# Altium schematic symbol library jlcpcb_2025_04_capacitors_extended_0603.schlib: 3668 symbols (part 9 of 20)
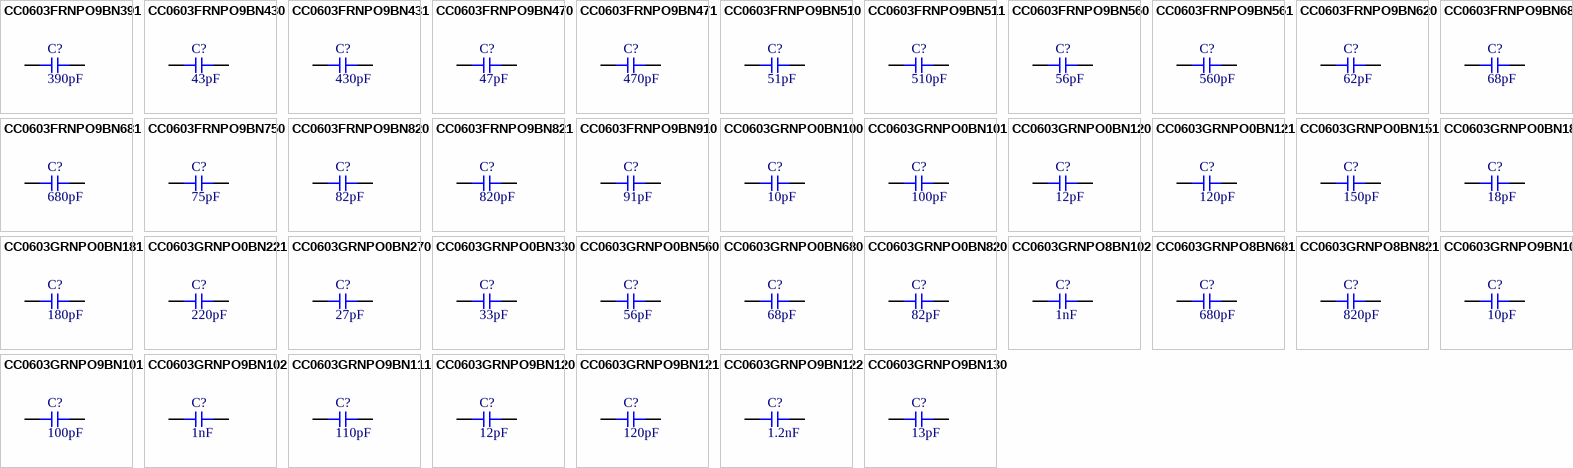
[diagram p99: symbols CC0603FRNPO9BN391 to CC0603GRNPO9BN130]

## CC0603FRNPO9BN470
designator C?  Capacitance: 47pF  (hidden comment: *)
Capacitor, Ceramic (MLCC), 47pF, ±1%, 50V, NP0, ±1%, SMD 0603; Manufacturer: YAGEO; Manufacturer Part Number: CC0603FRNPO9BN470; Package Size: 0603; JLCPCB Basic Part: No; JLCPCB Part Number: C519486; Supplier 1: LCSC; Category: Capacitors - MLCC; Supplier Part Number 1: C519486; Tolerance: ±1%; Voltage Rating: 50V; Temperature Coefficient: NP0; RoHS: Yes; ComponentLink1Description: Datasheet; ComponentLink1URL: https://wmsc.lcsc.com/wmsc/upload/file/pdf/v2/lcsc/2006011835_YAGEO-CC0603FRNPO9BN470_C519486.pdf; ComponentLink2Description: JLCPCB Part URL; ComponentLink2URL: https://jlcpcb.com/partdetail/C519486; ComponentLink3Description: LCSC Part URL; ComponentLink3URL: https://lcsc.com/product-detail/Multilayer-Ceramic-Capacitors-MLCC---SMD-SMT_YAGEO-YAGEO-CC0603FRNPO9BN470_C519486.html
footprint CAP-0603 (0603 (1608M) Capacitor)
pins: 1, 2

## CC0603FRNPO9BN471
designator C?  Capacitance: 470pF  (hidden comment: *)
Capacitor, Ceramic (MLCC), 470pF, ±1%, 50V, NP0, ±1%, SMD 0603; Manufacturer: YAGEO; Manufacturer Part Number: CC0603FRNPO9BN471; Package Size: 0603; JLCPCB Basic Part: No; JLCPCB Part Number: C519564; Supplier 1: LCSC; Category: Capacitors - MLCC; Supplier Part Number 1: C519564; Tolerance: ±1%; Voltage Rating: 50V; Temperature Coefficient: NP0; RoHS: Yes; ComponentLink1Description: Datasheet; ComponentLink1URL: https://wmsc.lcsc.com/wmsc/upload/file/pdf/v2/lcsc/2006011835_YAGEO-CC0603FRNPO9BN471_C519564.pdf; ComponentLink2Description: JLCPCB Part URL; ComponentLink2URL: https://jlcpcb.com/partdetail/C519564; ComponentLink3Description: LCSC Part URL; ComponentLink3URL: https://lcsc.com/product-detail/Multilayer-Ceramic-Capacitors-MLCC---SMD-SMT_YAGEO-YAGEO-CC0603FRNPO9BN471_C519564.html
footprint CAP-0603 (0603 (1608M) Capacitor)
pins: 1, 2

## CC0603FRNPO9BN510
designator C?  Capacitance: 51pF  (hidden comment: *)
Capacitor, Ceramic (MLCC), 51pF, ±1%, 50V, NP0, ±1%, SMD 0603; Manufacturer: YAGEO; Manufacturer Part Number: CC0603FRNPO9BN510; Package Size: 0603; JLCPCB Basic Part: No; JLCPCB Part Number: C519494; Supplier 1: LCSC; Category: Capacitors - MLCC; Supplier Part Number 1: C519494; Tolerance: ±1%; Voltage Rating: 50V; Temperature Coefficient: NP0; RoHS: Yes; ComponentLink1Description: Datasheet; ComponentLink1URL: https://wmsc.lcsc.com/wmsc/upload/file/pdf/v2/lcsc/2005141203_YAGEO-CC0603FRNPO9BN510_C519494.pdf; ComponentLink2Description: JLCPCB Part URL; ComponentLink2URL: https://jlcpcb.com/partdetail/C519494; ComponentLink3Description: LCSC Part URL; ComponentLink3URL: https://lcsc.com/product-detail/Multilayer-Ceramic-Capacitors-MLCC---SMD-SMT_YAGEO-YAGEO-CC0603FRNPO9BN510_C519494.html
footprint CAP-0603 (0603 (1608M) Capacitor)
pins: 1, 2

## CC0603FRNPO9BN511
designator C?  Capacitance: 510pF  (hidden comment: *)
Capacitor, Ceramic (MLCC), 510pF, ±1%, 50V, NP0, ±1%, SMD 0603; Manufacturer: YAGEO; Manufacturer Part Number: CC0603FRNPO9BN511; Package Size: 0603; JLCPCB Basic Part: No; JLCPCB Part Number: C519572; Supplier 1: LCSC; Category: Capacitors - MLCC; Supplier Part Number 1: C519572; Tolerance: ±1%; Voltage Rating: 50V; Temperature Coefficient: NP0; RoHS: Yes; ComponentLink1Description: Datasheet; ComponentLink1URL: https://wmsc.lcsc.com/wmsc/upload/file/pdf/v2/lcsc/2008122133_YAGEO-CC0603FRNPO9BN511_C519572.pdf; ComponentLink2Description: JLCPCB Part URL; ComponentLink2URL: https://jlcpcb.com/partdetail/C519572; ComponentLink3Description: LCSC Part URL; ComponentLink3URL: https://lcsc.com/product-detail/Multilayer-Ceramic-Capacitors-MLCC---SMD-SMT_YAGEO-YAGEO-CC0603FRNPO9BN511_C519572.html
footprint CAP-0603 (0603 (1608M) Capacitor)
pins: 1, 2

## CC0603FRNPO9BN560
designator C?  Capacitance: 56pF  (hidden comment: *)
Capacitor, Ceramic (MLCC), 56pF, ±1%, 50V, NP0, ±1%, SMD 0603; Manufacturer: YAGEO; Manufacturer Part Number: CC0603FRNPO9BN560; Package Size: 0603; JLCPCB Basic Part: No; JLCPCB Part Number: C527049; Supplier 1: LCSC; Category: Capacitors - MLCC; Supplier Part Number 1: C527049; Tolerance: ±1%; Voltage Rating: 50V; Temperature Coefficient: NP0; RoHS: Yes; ComponentLink1Description: Datasheet; ComponentLink1URL: https://wmsc.lcsc.com/wmsc/upload/file/pdf/v2/lcsc/2006181535_YAGEO-CC0603FRNPO9BN560_C527049.pdf; ComponentLink2Description: JLCPCB Part URL; ComponentLink2URL: https://jlcpcb.com/partdetail/C527049; ComponentLink3Description: LCSC Part URL; ComponentLink3URL: https://lcsc.com/product-detail/Multilayer-Ceramic-Capacitors-MLCC---SMD-SMT_YAGEO-YAGEO-CC0603FRNPO9BN560_C527049.html
footprint CAP-0603 (0603 (1608M) Capacitor)
pins: 1, 2

## CC0603FRNPO9BN561
designator C?  Capacitance: 560pF  (hidden comment: *)
Capacitor, Ceramic (MLCC), 560pF, ±1%, 50V, NP0, ±1%, SMD 0603; Manufacturer: YAGEO; Manufacturer Part Number: CC0603FRNPO9BN561; Package Size: 0603; JLCPCB Basic Part: No; JLCPCB Part Number: C519565; Supplier 1: LCSC; Category: Capacitors - MLCC; Supplier Part Number 1: C519565; Tolerance: ±1%; Voltage Rating: 50V; Temperature Coefficient: NP0; RoHS: Yes; ComponentLink1Description: Datasheet; ComponentLink1URL: https://wmsc.lcsc.com/wmsc/upload/file/pdf/v2/lcsc/2006011835_YAGEO-CC0603FRNPO9BN561_C519565.pdf; ComponentLink2Description: JLCPCB Part URL; ComponentLink2URL: https://jlcpcb.com/partdetail/C519565; ComponentLink3Description: LCSC Part URL; ComponentLink3URL: https://lcsc.com/product-detail/Multilayer-Ceramic-Capacitors-MLCC---SMD-SMT_YAGEO-YAGEO-CC0603FRNPO9BN561_C519565.html
footprint CAP-0603 (0603 (1608M) Capacitor)
pins: 1, 2

## CC0603FRNPO9BN620
designator C?  Capacitance: 62pF  (hidden comment: *)
Capacitor, Ceramic (MLCC), 62pF, ±1%, 50V, NP0, ±1%, SMD 0603; Manufacturer: YAGEO; Manufacturer Part Number: CC0603FRNPO9BN620; Package Size: 0603; JLCPCB Basic Part: No; JLCPCB Part Number: C519495; Supplier 1: LCSC; Category: Capacitors - MLCC; Supplier Part Number 1: C519495; Tolerance: ±1%; Voltage Rating: 50V; Temperature Coefficient: NP0; RoHS: Yes; ComponentLink1Description: Datasheet; ComponentLink1URL: https://wmsc.lcsc.com/wmsc/upload/file/pdf/v2/lcsc/2008122133_YAGEO-CC0603FRNPO9BN620_C519495.pdf; ComponentLink2Description: JLCPCB Part URL; ComponentLink2URL: https://jlcpcb.com/partdetail/C519495; ComponentLink3Description: LCSC Part URL; ComponentLink3URL: https://lcsc.com/product-detail/Multilayer-Ceramic-Capacitors-MLCC---SMD-SMT_YAGEO-YAGEO-CC0603FRNPO9BN620_C519495.html
footprint CAP-0603 (0603 (1608M) Capacitor)
pins: 1, 2

## CC0603FRNPO9BN680
designator C?  Capacitance: 68pF  (hidden comment: *)
Capacitor, Ceramic (MLCC), 68pF, ±1%, 50V, NP0, ±1%, SMD 0603; Manufacturer: YAGEO; Manufacturer Part Number: CC0603FRNPO9BN680; Package Size: 0603; JLCPCB Basic Part: No; JLCPCB Part Number: C513699; Supplier 1: LCSC; Category: Capacitors - MLCC; Supplier Part Number 1: C513699; Tolerance: ±1%; Voltage Rating: 50V; Temperature Coefficient: NP0; RoHS: Yes; ComponentLink1Description: Datasheet; ComponentLink1URL: https://wmsc.lcsc.com/wmsc/upload/file/pdf/v2/lcsc/2204121100_YAGEO-CC0603FRNPO9BN680_C513699.pdf; ComponentLink2Description: JLCPCB Part URL; ComponentLink2URL: https://jlcpcb.com/partdetail/C513699; ComponentLink3Description: LCSC Part URL; ComponentLink3URL: https://lcsc.com/product-detail/Multilayer-Ceramic-Capacitors-MLCC---SMD-SMT_YAGEO-YAGEO-CC0603FRNPO9BN680_C513699.html
footprint CAP-0603 (0603 (1608M) Capacitor)
pins: 1, 2

## CC0603FRNPO9BN681
designator C?  Capacitance: 680pF  (hidden comment: *)
Capacitor, Ceramic (MLCC), 680pF, ±1%, 50V, NP0, ±1%, SMD 0603; Manufacturer: YAGEO; Manufacturer Part Number: CC0603FRNPO9BN681; Package Size: 0603; JLCPCB Basic Part: No; JLCPCB Part Number: C519566; Supplier 1: LCSC; Category: Capacitors - MLCC; Supplier Part Number 1: C519566; Tolerance: ±1%; Voltage Rating: 50V; Temperature Coefficient: NP0; RoHS: Yes; ComponentLink1Description: Datasheet; ComponentLink1URL: https://wmsc.lcsc.com/wmsc/upload/file/pdf/v2/lcsc/2006011835_YAGEO-CC0603FRNPO9BN681_C519566.pdf; ComponentLink2Description: JLCPCB Part URL; ComponentLink2URL: https://jlcpcb.com/partdetail/C519566; ComponentLink3Description: LCSC Part URL; ComponentLink3URL: https://lcsc.com/product-detail/Multilayer-Ceramic-Capacitors-MLCC---SMD-SMT_YAGEO-YAGEO-CC0603FRNPO9BN681_C519566.html
footprint CAP-0603 (0603 (1608M) Capacitor)
pins: 1, 2

## CC0603FRNPO9BN750
designator C?  Capacitance: 75pF  (hidden comment: *)
Capacitor, Ceramic (MLCC), 75pF, ±1%, 50V, NP0, ±1%, SMD 0603; Manufacturer: YAGEO; Manufacturer Part Number: CC0603FRNPO9BN750; Package Size: 0603; JLCPCB Basic Part: No; JLCPCB Part Number: C519496; Supplier 1: LCSC; Category: Capacitors - MLCC; Supplier Part Number 1: C519496; Tolerance: ±1%; Voltage Rating: 50V; Temperature Coefficient: NP0; RoHS: Yes; ComponentLink1Description: Datasheet; ComponentLink1URL: https://wmsc.lcsc.com/wmsc/upload/file/pdf/v2/lcsc/2005181835_YAGEO-CC0603FRNPO9BN750_C519496.pdf; ComponentLink2Description: JLCPCB Part URL; ComponentLink2URL: https://jlcpcb.com/partdetail/C519496; ComponentLink3Description: LCSC Part URL; ComponentLink3URL: https://lcsc.com/product-detail/Multilayer-Ceramic-Capacitors-MLCC---SMD-SMT_YAGEO-YAGEO-CC0603FRNPO9BN750_C519496.html
footprint CAP-0603 (0603 (1608M) Capacitor)
pins: 1, 2

## CC0603FRNPO9BN820
designator C?  Capacitance: 82pF  (hidden comment: *)
Capacitor, Ceramic (MLCC), 82pF, ±1%, 50V, NP0, ±1%, SMD 0603; Manufacturer: YAGEO; Manufacturer Part Number: CC0603FRNPO9BN820; Package Size: 0603; JLCPCB Basic Part: No; JLCPCB Part Number: C519487; Supplier 1: LCSC; Category: Capacitors - MLCC; Supplier Part Number 1: C519487; Tolerance: ±1%; Voltage Rating: 50V; Temperature Coefficient: NP0; RoHS: Yes; ComponentLink1Description: Datasheet; ComponentLink1URL: https://wmsc.lcsc.com/wmsc/upload/file/pdf/v2/lcsc/2006011835_YAGEO-CC0603FRNPO9BN820_C519487.pdf; ComponentLink2Description: JLCPCB Part URL; ComponentLink2URL: https://jlcpcb.com/partdetail/C519487; ComponentLink3Description: LCSC Part URL; ComponentLink3URL: https://lcsc.com/product-detail/Multilayer-Ceramic-Capacitors-MLCC---SMD-SMT_YAGEO-YAGEO-CC0603FRNPO9BN820_C519487.html
footprint CAP-0603 (0603 (1608M) Capacitor)
pins: 1, 2

## CC0603FRNPO9BN821
designator C?  Capacitance: 820pF  (hidden comment: *)
Capacitor, Ceramic (MLCC), 820pF, ±1%, 50V, NP0, ±1%, SMD 0603; Manufacturer: YAGEO; Manufacturer Part Number: CC0603FRNPO9BN821; Package Size: 0603; JLCPCB Basic Part: No; JLCPCB Part Number: C519567; Supplier 1: LCSC; Category: Capacitors - MLCC; Supplier Part Number 1: C519567; Tolerance: ±1%; Voltage Rating: 50V; Temperature Coefficient: NP0; RoHS: Yes; ComponentLink1Description: Datasheet; ComponentLink1URL: https://wmsc.lcsc.com/wmsc/upload/file/pdf/v2/lcsc/2008191833_YAGEO-CC0603FRNPO9BN821_C519567.pdf; ComponentLink2Description: JLCPCB Part URL; ComponentLink2URL: https://jlcpcb.com/partdetail/C519567; ComponentLink3Description: LCSC Part URL; ComponentLink3URL: https://lcsc.com/product-detail/Multilayer-Ceramic-Capacitors-MLCC---SMD-SMT_YAGEO-YAGEO-CC0603FRNPO9BN821_C519567.html
footprint CAP-0603 (0603 (1608M) Capacitor)
pins: 1, 2

## CC0603FRNPO9BN910
designator C?  Capacitance: 91pF  (hidden comment: *)
Capacitor, Ceramic (MLCC), 91pF, ±1%, 50V, NP0, ±1%, SMD 0603; Manufacturer: YAGEO; Manufacturer Part Number: CC0603FRNPO9BN910; Package Size: 0603; JLCPCB Basic Part: No; JLCPCB Part Number: C519497; Supplier 1: LCSC; Category: Capacitors - MLCC; Supplier Part Number 1: C519497; Tolerance: ±1%; Voltage Rating: 50V; Temperature Coefficient: NP0; RoHS: Yes; ComponentLink1Description: Datasheet; ComponentLink1URL: https://wmsc.lcsc.com/wmsc/upload/file/pdf/v2/lcsc/2006011835_YAGEO-CC0603FRNPO9BN910_C519497.pdf; ComponentLink2Description: JLCPCB Part URL; ComponentLink2URL: https://jlcpcb.com/partdetail/C519497; ComponentLink3Description: LCSC Part URL; ComponentLink3URL: https://lcsc.com/product-detail/Multilayer-Ceramic-Capacitors-MLCC---SMD-SMT_YAGEO-YAGEO-CC0603FRNPO9BN910_C519497.html
footprint CAP-0603 (0603 (1608M) Capacitor)
pins: 1, 2

## CC0603GRNPO0BN100
designator C?  Capacitance: 10pF  (hidden comment: *)
Capacitor, Ceramic (MLCC), 10pF, ±2%, 100V, NP0, ±2%, SMD 0603; Manufacturer: YAGEO; Manufacturer Part Number: CC0603GRNPO0BN100; Package Size: 0603; JLCPCB Basic Part: No; JLCPCB Part Number: C527050; Supplier 1: LCSC; Category: Capacitors - MLCC; Supplier Part Number 1: C527050; Tolerance: ±2%; Voltage Rating: 100V; Temperature Coefficient: NP0; RoHS: Yes; ComponentLink1Description: Datasheet; ComponentLink1URL: https://wmsc.lcsc.com/wmsc/upload/file/pdf/v2/lcsc/2006241834_YAGEO-CC0603GRNPO0BN100_C527050.pdf; ComponentLink2Description: JLCPCB Part URL; ComponentLink2URL: https://jlcpcb.com/partdetail/C527050; ComponentLink3Description: LCSC Part URL; ComponentLink3URL: https://lcsc.com/product-detail/Multilayer-Ceramic-Capacitors-MLCC---SMD-SMT_YAGEO-YAGEO-CC0603GRNPO0BN100_C527050.html
footprint CAP-0603 (0603 (1608M) Capacitor)
pins: 1, 2

## CC0603GRNPO0BN101
designator C?  Capacitance: 100pF  (hidden comment: *)
Capacitor, Ceramic (MLCC), 100pF, ±2%, 100V, NP0, ±2%, SMD 0603; Manufacturer: YAGEO; Manufacturer Part Number: CC0603GRNPO0BN101; Package Size: 0603; JLCPCB Basic Part: No; JLCPCB Part Number: C576781; Supplier 1: LCSC; Category: Capacitors - MLCC; Supplier Part Number 1: C576781; Tolerance: ±2%; Voltage Rating: 100V; Temperature Coefficient: NP0; RoHS: Yes; ComponentLink1Description: Datasheet; ComponentLink1URL: https://wmsc.lcsc.com/wmsc/upload/file/pdf/v2/lcsc/2311211121_YAGEO-CC0603GRNPO0BN101_C576781.pdf; ComponentLink2Description: JLCPCB Part URL; ComponentLink2URL: https://jlcpcb.com/partdetail/C576781; ComponentLink3Description: LCSC Part URL; ComponentLink3URL: https://lcsc.com/product-detail/Multilayer-Ceramic-Capacitors-MLCC---SMD-SMT_YAGEO-YAGEO-CC0603GRNPO0BN101_C576781.html
footprint CAP-0603 (0603 (1608M) Capacitor)
pins: 1, 2

## CC0603GRNPO0BN120
designator C?  Capacitance: 12pF  (hidden comment: *)
Capacitor, Ceramic (MLCC), 12pF, ±2%, 100V, NP0, ±2%, SMD 0603; Manufacturer: YAGEO; Manufacturer Part Number: CC0603GRNPO0BN120; Package Size: 0603; JLCPCB Basic Part: No; JLCPCB Part Number: C527051; Supplier 1: LCSC; Category: Capacitors - MLCC; Supplier Part Number 1: C527051; Tolerance: ±2%; Voltage Rating: 100V; Temperature Coefficient: NP0; RoHS: Yes; ComponentLink1Description: Datasheet; ComponentLink1URL: https://wmsc.lcsc.com/wmsc/upload/file/pdf/v2/lcsc/2007221234_YAGEO-CC0603GRNPO0BN120_C527051.pdf; ComponentLink2Description: JLCPCB Part URL; ComponentLink2URL: https://jlcpcb.com/partdetail/C527051; ComponentLink3Description: LCSC Part URL; ComponentLink3URL: https://lcsc.com/product-detail/Multilayer-Ceramic-Capacitors-MLCC---SMD-SMT_YAGEO-YAGEO-CC0603GRNPO0BN120_C527051.html
footprint CAP-0603 (0603 (1608M) Capacitor)
pins: 1, 2

## CC0603GRNPO0BN121
designator C?  Capacitance: 120pF  (hidden comment: *)
Capacitor, Ceramic (MLCC), 120pF, ±2%, 100V, NP0, ±2%, SMD 0603; Manufacturer: YAGEO; Manufacturer Part Number: CC0603GRNPO0BN121; Package Size: 0603; JLCPCB Basic Part: No; JLCPCB Part Number: C527052; Supplier 1: LCSC; Category: Capacitors - MLCC; Supplier Part Number 1: C527052; Tolerance: ±2%; Voltage Rating: 100V; Temperature Coefficient: NP0; RoHS: Yes; ComponentLink1Description: Datasheet; ComponentLink1URL: https://wmsc.lcsc.com/wmsc/upload/file/pdf/v2/lcsc/2006181535_YAGEO-CC0603GRNPO0BN121_C527052.pdf; ComponentLink2Description: JLCPCB Part URL; ComponentLink2URL: https://jlcpcb.com/partdetail/C527052; ComponentLink3Description: LCSC Part URL; ComponentLink3URL: https://lcsc.com/product-detail/Multilayer-Ceramic-Capacitors-MLCC---SMD-SMT_YAGEO-YAGEO-CC0603GRNPO0BN121_C527052.html
footprint CAP-0603 (0603 (1608M) Capacitor)
pins: 1, 2

## CC0603GRNPO0BN151
designator C?  Capacitance: 150pF  (hidden comment: *)
Capacitor, Ceramic (MLCC), 150pF, ±2%, 100V, NP0, ±2%, SMD 0603; Manufacturer: YAGEO; Manufacturer Part Number: CC0603GRNPO0BN151; Package Size: 0603; JLCPCB Basic Part: No; JLCPCB Part Number: C576784; Supplier 1: LCSC; Category: Capacitors - MLCC; Supplier Part Number 1: C576784; Tolerance: ±2%; Voltage Rating: 100V; Temperature Coefficient: NP0; RoHS: Yes; ComponentLink1Description: Datasheet; ComponentLink1URL: https://wmsc.lcsc.com/wmsc/upload/file/pdf/v2/lcsc/2311211121_YAGEO-CC0603GRNPO0BN151_C576784.pdf; ComponentLink2Description: JLCPCB Part URL; ComponentLink2URL: https://jlcpcb.com/partdetail/C576784; ComponentLink3Description: LCSC Part URL; ComponentLink3URL: https://lcsc.com/product-detail/Multilayer-Ceramic-Capacitors-MLCC---SMD-SMT_YAGEO-YAGEO-CC0603GRNPO0BN151_C576784.html
footprint CAP-0603 (0603 (1608M) Capacitor)
pins: 1, 2

## CC0603GRNPO0BN180
designator C?  Capacitance: 18pF  (hidden comment: *)
Capacitor, Ceramic (MLCC), 18pF, ±2%, 100V, NP0, ±2%, SMD 0603; Manufacturer: YAGEO; Manufacturer Part Number: CC0603GRNPO0BN180; Package Size: 0603; JLCPCB Basic Part: No; JLCPCB Part Number: C576786; Supplier 1: LCSC; Category: Capacitors - MLCC; Supplier Part Number 1: C576786; Tolerance: ±2%; Voltage Rating: 100V; Temperature Coefficient: NP0; RoHS: Yes; ComponentLink1Description: Datasheet; ComponentLink1URL: https://wmsc.lcsc.com/wmsc/upload/file/pdf/v2/lcsc/2211281000_YAGEO-CC0603GRNPO0BN180_C576786.pdf; ComponentLink2Description: JLCPCB Part URL; ComponentLink2URL: https://jlcpcb.com/partdetail/C576786; ComponentLink3Description: LCSC Part URL; ComponentLink3URL: https://lcsc.com/product-detail/Multilayer-Ceramic-Capacitors-MLCC---SMD-SMT_YAGEO-YAGEO-CC0603GRNPO0BN180_C576786.html
footprint CAP-0603 (0603 (1608M) Capacitor)
pins: 1, 2

## CC0603GRNPO0BN181
designator C?  Capacitance: 180pF  (hidden comment: *)
Capacitor, Ceramic (MLCC), 180pF, ±2%, 100V, NP0, ±2%, SMD 0603; Manufacturer: YAGEO; Manufacturer Part Number: CC0603GRNPO0BN181; Package Size: 0603; JLCPCB Basic Part: No; JLCPCB Part Number: C527053; Supplier 1: LCSC; Category: Capacitors - MLCC; Supplier Part Number 1: C527053; Tolerance: ±2%; Voltage Rating: 100V; Temperature Coefficient: NP0; RoHS: Yes; ComponentLink1Description: Datasheet; ComponentLink1URL: https://wmsc.lcsc.com/wmsc/upload/file/pdf/v2/lcsc/2008131832_YAGEO-CC0603GRNPO0BN181_C527053.pdf; ComponentLink2Description: JLCPCB Part URL; ComponentLink2URL: https://jlcpcb.com/partdetail/C527053; ComponentLink3Description: LCSC Part URL; ComponentLink3URL: https://lcsc.com/product-detail/Multilayer-Ceramic-Capacitors-MLCC---SMD-SMT_YAGEO-YAGEO-CC0603GRNPO0BN181_C527053.html
footprint CAP-0603 (0603 (1608M) Capacitor)
pins: 1, 2

## CC0603GRNPO0BN221
designator C?  Capacitance: 220pF  (hidden comment: *)
Capacitor, Ceramic (MLCC), 220pF, ±2%, 100V, NP0, ±2%, SMD 0603; Manufacturer: YAGEO; Manufacturer Part Number: CC0603GRNPO0BN221; Package Size: 0603; JLCPCB Basic Part: No; JLCPCB Part Number: C576788; Supplier 1: LCSC; Category: Capacitors - MLCC; Supplier Part Number 1: C576788; Tolerance: ±2%; Voltage Rating: 100V; Temperature Coefficient: NP0; RoHS: Yes; ComponentLink1Description: Datasheet; ComponentLink1URL: https://wmsc.lcsc.com/wmsc/upload/file/pdf/v2/lcsc/2009261808_YAGEO-CC0603GRNPO0BN221_C576788.pdf; ComponentLink2Description: JLCPCB Part URL; ComponentLink2URL: https://jlcpcb.com/partdetail/C576788; ComponentLink3Description: LCSC Part URL; ComponentLink3URL: https://lcsc.com/product-detail/Multilayer-Ceramic-Capacitors-MLCC---SMD-SMT_YAGEO-YAGEO-CC0603GRNPO0BN221_C576788.html
footprint CAP-0603 (0603 (1608M) Capacitor)
pins: 1, 2

## CC0603GRNPO0BN270
designator C?  Capacitance: 27pF  (hidden comment: *)
Capacitor, Ceramic (MLCC), 27pF, ±2%, 100V, NP0, ±2%, SMD 0603; Manufacturer: YAGEO; Manufacturer Part Number: CC0603GRNPO0BN270; Package Size: 0603; JLCPCB Basic Part: No; JLCPCB Part Number: C527055; Supplier 1: LCSC; Category: Capacitors - MLCC; Supplier Part Number 1: C527055; Tolerance: ±2%; Voltage Rating: 100V; Temperature Coefficient: NP0; RoHS: Yes; ComponentLink1Description: Datasheet; ComponentLink1URL: https://wmsc.lcsc.com/wmsc/upload/file/pdf/v2/lcsc/2006181535_YAGEO-CC0603GRNPO0BN270_C527055.pdf; ComponentLink2Description: JLCPCB Part URL; ComponentLink2URL: https://jlcpcb.com/partdetail/C527055; ComponentLink3Description: LCSC Part URL; ComponentLink3URL: https://lcsc.com/product-detail/Multilayer-Ceramic-Capacitors-MLCC---SMD-SMT_YAGEO-YAGEO-CC0603GRNPO0BN270_C527055.html
footprint CAP-0603 (0603 (1608M) Capacitor)
pins: 1, 2

## CC0603GRNPO0BN330
designator C?  Capacitance: 33pF  (hidden comment: *)
Capacitor, Ceramic (MLCC), 33pF, ±2%, 100V, NP0, ±2%, SMD 0603; Manufacturer: YAGEO; Manufacturer Part Number: CC0603GRNPO0BN330; Package Size: 0603; JLCPCB Basic Part: No; JLCPCB Part Number: C527056; Supplier 1: LCSC; Category: Capacitors - MLCC; Supplier Part Number 1: C527056; Tolerance: ±2%; Voltage Rating: 100V; Temperature Coefficient: NP0; RoHS: Yes; ComponentLink1Description: Datasheet; ComponentLink1URL: https://wmsc.lcsc.com/wmsc/upload/file/pdf/v2/lcsc/2007021836_YAGEO-CC0603GRNPO0BN330_C527056.pdf; ComponentLink2Description: JLCPCB Part URL; ComponentLink2URL: https://jlcpcb.com/partdetail/C527056; ComponentLink3Description: LCSC Part URL; ComponentLink3URL: https://lcsc.com/product-detail/Multilayer-Ceramic-Capacitors-MLCC---SMD-SMT_YAGEO-YAGEO-CC0603GRNPO0BN330_C527056.html
footprint CAP-0603 (0603 (1608M) Capacitor)
pins: 1, 2

## CC0603GRNPO0BN560
designator C?  Capacitance: 56pF  (hidden comment: *)
Capacitor, Ceramic (MLCC), 56pF, ±2%, 100V, NP0, ±2%, SMD 0603; Manufacturer: YAGEO; Manufacturer Part Number: CC0603GRNPO0BN560; Package Size: 0603; JLCPCB Basic Part: No; JLCPCB Part Number: C527058; Supplier 1: LCSC; Category: Capacitors - MLCC; Supplier Part Number 1: C527058; Tolerance: ±2%; Voltage Rating: 100V; Temperature Coefficient: NP0; RoHS: Yes; ComponentLink1Description: Datasheet; ComponentLink1URL: https://wmsc.lcsc.com/wmsc/upload/file/pdf/v2/lcsc/2005222139_YAGEO-CC0603GRNPO0BN560_C527058.pdf; ComponentLink2Description: JLCPCB Part URL; ComponentLink2URL: https://jlcpcb.com/partdetail/C527058; ComponentLink3Description: LCSC Part URL; ComponentLink3URL: https://lcsc.com/product-detail/Multilayer-Ceramic-Capacitors-MLCC---SMD-SMT_YAGEO-YAGEO-CC0603GRNPO0BN560_C527058.html
footprint CAP-0603 (0603 (1608M) Capacitor)
pins: 1, 2

## CC0603GRNPO0BN680
designator C?  Capacitance: 68pF  (hidden comment: *)
Capacitor, Ceramic (MLCC), 68pF, ±2%, 100V, NP0, ±2%, SMD 0603; Manufacturer: YAGEO; Manufacturer Part Number: CC0603GRNPO0BN680; Package Size: 0603; JLCPCB Basic Part: No; JLCPCB Part Number: C576791; Supplier 1: LCSC; Category: Capacitors - MLCC; Supplier Part Number 1: C576791; Tolerance: ±2%; Voltage Rating: 100V; Temperature Coefficient: NP0; RoHS: Yes; ComponentLink1Description: Datasheet; ComponentLink1URL: https://wmsc.lcsc.com/wmsc/upload/file/pdf/v2/lcsc/2303021100_YAGEO-CC0603GRNPO0BN680_C576791.pdf; ComponentLink2Description: JLCPCB Part URL; ComponentLink2URL: https://jlcpcb.com/partdetail/C576791; ComponentLink3Description: LCSC Part URL; ComponentLink3URL: https://lcsc.com/product-detail/Multilayer-Ceramic-Capacitors-MLCC---SMD-SMT_YAGEO-YAGEO-CC0603GRNPO0BN680_C576791.html
footprint CAP-0603 (0603 (1608M) Capacitor)
pins: 1, 2

## CC0603GRNPO0BN820
designator C?  Capacitance: 82pF  (hidden comment: *)
Capacitor, Ceramic (MLCC), 82pF, ±2%, 100V, NP0, ±2%, SMD 0603; Manufacturer: YAGEO; Manufacturer Part Number: CC0603GRNPO0BN820; Package Size: 0603; JLCPCB Basic Part: No; JLCPCB Part Number: C576792; Supplier 1: LCSC; Category: Capacitors - MLCC; Supplier Part Number 1: C576792; Tolerance: ±2%; Voltage Rating: 100V; Temperature Coefficient: NP0; RoHS: Yes; ComponentLink1Description: Datasheet; ComponentLink1URL: https://wmsc.lcsc.com/wmsc/upload/file/pdf/v2/lcsc/2009261808_YAGEO-CC0603GRNPO0BN820_C576792.pdf; ComponentLink2Description: JLCPCB Part URL; ComponentLink2URL: https://jlcpcb.com/partdetail/C576792; ComponentLink3Description: LCSC Part URL; ComponentLink3URL: https://lcsc.com/product-detail/Multilayer-Ceramic-Capacitors-MLCC---SMD-SMT_YAGEO-YAGEO-CC0603GRNPO0BN820_C576792.html
footprint CAP-0603 (0603 (1608M) Capacitor)
pins: 1, 2

## CC0603GRNPO8BN102
designator C?  Capacitance: 1nF  (hidden comment: *)
Capacitor, Ceramic (MLCC), 1nF, ±2%, 25V, NP0, ±2%, SMD 0603; Manufacturer: YAGEO; Manufacturer Part Number: CC0603GRNPO8BN102; Package Size: 0603; JLCPCB Basic Part: No; JLCPCB Part Number: C519480; Supplier 1: LCSC; Category: Capacitors - MLCC; Supplier Part Number 1: C519480; Tolerance: ±2%; Voltage Rating: 25V; Temperature Coefficient: NP0; RoHS: Yes; ComponentLink1Description: Datasheet; ComponentLink1URL: https://wmsc.lcsc.com/wmsc/upload/file/pdf/v2/lcsc/2005181835_YAGEO-CC0603GRNPO8BN102_C519480.pdf; ComponentLink2Description: JLCPCB Part URL; ComponentLink2URL: https://jlcpcb.com/partdetail/C519480; ComponentLink3Description: LCSC Part URL; ComponentLink3URL: https://lcsc.com/product-detail/Multilayer-Ceramic-Capacitors-MLCC---SMD-SMT_YAGEO-YAGEO-CC0603GRNPO8BN102_C519480.html
footprint CAP-0603 (0603 (1608M) Capacitor)
pins: 1, 2

## CC0603GRNPO8BN681
designator C?  Capacitance: 680pF  (hidden comment: *)
Capacitor, Ceramic (MLCC), 680pF, ±2%, 25V, NP0, ±2%, SMD 0603; Manufacturer: YAGEO; Manufacturer Part Number: CC0603GRNPO8BN681; Package Size: 0603; JLCPCB Basic Part: No; JLCPCB Part Number: C527059; Supplier 1: LCSC; Category: Capacitors - MLCC; Supplier Part Number 1: C527059; Tolerance: ±2%; Voltage Rating: 25V; Temperature Coefficient: NP0; RoHS: Yes; ComponentLink1Description: Datasheet; ComponentLink1URL: https://wmsc.lcsc.com/wmsc/upload/file/pdf/v2/lcsc/2007221234_YAGEO-CC0603GRNPO8BN681_C527059.pdf; ComponentLink2Description: JLCPCB Part URL; ComponentLink2URL: https://jlcpcb.com/partdetail/C527059; ComponentLink3Description: LCSC Part URL; ComponentLink3URL: https://lcsc.com/product-detail/Multilayer-Ceramic-Capacitors-MLCC---SMD-SMT_YAGEO-YAGEO-CC0603GRNPO8BN681_C527059.html
footprint CAP-0603 (0603 (1608M) Capacitor)
pins: 1, 2

## CC0603GRNPO8BN821
designator C?  Capacitance: 820pF  (hidden comment: *)
Capacitor, Ceramic (MLCC), 820pF, ±2%, 25V, NP0, ±2%, SMD 0603; Manufacturer: YAGEO; Manufacturer Part Number: CC0603GRNPO8BN821; Package Size: 0603; JLCPCB Basic Part: No; JLCPCB Part Number: C519470; Supplier 1: LCSC; Category: Capacitors - MLCC; Supplier Part Number 1: C519470; Tolerance: ±2%; Voltage Rating: 25V; Temperature Coefficient: NP0; RoHS: Yes; ComponentLink1Description: Datasheet; ComponentLink1URL: https://wmsc.lcsc.com/wmsc/upload/file/pdf/v2/lcsc/2010251433_YAGEO-CC0603GRNPO8BN821_C519470.pdf; ComponentLink2Description: JLCPCB Part URL; ComponentLink2URL: https://jlcpcb.com/partdetail/C519470; ComponentLink3Description: LCSC Part URL; ComponentLink3URL: https://lcsc.com/product-detail/Multilayer-Ceramic-Capacitors-MLCC---SMD-SMT_YAGEO-YAGEO-CC0603GRNPO8BN821_C519470.html
footprint CAP-0603 (0603 (1608M) Capacitor)
pins: 1, 2

## CC0603GRNPO9BN100
designator C?  Capacitance: 10pF  (hidden comment: *)
Capacitor, Ceramic (MLCC), 10pF, ±2%, 50V, NP0, ±2%, SMD 0603; Manufacturer: YAGEO; Manufacturer Part Number: CC0603GRNPO9BN100; Package Size: 0603; JLCPCB Basic Part: No; JLCPCB Part Number: C325468; Supplier 1: LCSC; Category: Capacitors - MLCC; Supplier Part Number 1: C325468; Tolerance: ±2%; Voltage Rating: 50V; Temperature Coefficient: NP0; RoHS: Yes; ComponentLink1Description: Datasheet; ComponentLink1URL: https://wmsc.lcsc.com/wmsc/upload/file/pdf/v2/lcsc/2304140030_YAGEO-CC0603GRNPO9BN100_C325468.pdf; ComponentLink2Description: JLCPCB Part URL; ComponentLink2URL: https://jlcpcb.com/partdetail/C325468; ComponentLink3Description: LCSC Part URL; ComponentLink3URL: https://lcsc.com/product-detail/Multilayer-Ceramic-Capacitors-MLCC---SMD-SMT_YAGEO-YAGEO-CC0603GRNPO9BN100_C325468.html
footprint CAP-0603 (0603 (1608M) Capacitor)
pins: 1, 2

## CC0603GRNPO9BN101
designator C?  Capacitance: 100pF  (hidden comment: *)
Capacitor, Ceramic (MLCC), 100pF, ±2%, 50V, NP0, ±2%, SMD 0603; Manufacturer: YAGEO; Manufacturer Part Number: CC0603GRNPO9BN101; Package Size: 0603; JLCPCB Basic Part: No; JLCPCB Part Number: C519449; Supplier 1: LCSC; Category: Capacitors - MLCC; Supplier Part Number 1: C519449; Tolerance: ±2%; Voltage Rating: 50V; Temperature Coefficient: NP0; RoHS: Yes; ComponentLink1Description: Datasheet; ComponentLink1URL: https://wmsc.lcsc.com/wmsc/upload/file/pdf/v2/lcsc/2005181835_YAGEO-CC0603GRNPO9BN101_C519449.pdf; ComponentLink2Description: JLCPCB Part URL; ComponentLink2URL: https://jlcpcb.com/partdetail/C519449; ComponentLink3Description: LCSC Part URL; ComponentLink3URL: https://lcsc.com/product-detail/Multilayer-Ceramic-Capacitors-MLCC---SMD-SMT_YAGEO-YAGEO-CC0603GRNPO9BN101_C519449.html
footprint CAP-0603 (0603 (1608M) Capacitor)
pins: 1, 2

## CC0603GRNPO9BN102
designator C?  Capacitance: 1nF  (hidden comment: *)
Capacitor, Ceramic (MLCC), 1nF, ±2%, 50V, NP0, ±2%, SMD 0603; Manufacturer: YAGEO; Manufacturer Part Number: CC0603GRNPO9BN102; Package Size: 0603; JLCPCB Basic Part: No; JLCPCB Part Number: C519481; Supplier 1: LCSC; Category: Capacitors - MLCC; Supplier Part Number 1: C519481; Tolerance: ±2%; Voltage Rating: 50V; Temperature Coefficient: NP0; RoHS: Yes; ComponentLink1Description: Datasheet; ComponentLink1URL: https://wmsc.lcsc.com/wmsc/upload/file/pdf/v2/lcsc/2007101233_YAGEO-CC0603GRNPO9BN102_C519481.pdf; ComponentLink2Description: JLCPCB Part URL; ComponentLink2URL: https://jlcpcb.com/partdetail/C519481; ComponentLink3Description: LCSC Part URL; ComponentLink3URL: https://lcsc.com/product-detail/Multilayer-Ceramic-Capacitors-MLCC---SMD-SMT_YAGEO-YAGEO-CC0603GRNPO9BN102_C519481.html
footprint CAP-0603 (0603 (1608M) Capacitor)
pins: 1, 2

## CC0603GRNPO9BN111
designator C?  Capacitance: 110pF  (hidden comment: *)
Capacitor, Ceramic (MLCC), 110pF, ±2%, 50V, NP0, ±2%, SMD 0603; Manufacturer: YAGEO; Manufacturer Part Number: CC0603GRNPO9BN111; Package Size: 0603; JLCPCB Basic Part: No; JLCPCB Part Number: C519475; Supplier 1: LCSC; Category: Capacitors - MLCC; Supplier Part Number 1: C519475; Tolerance: ±2%; Voltage Rating: 50V; Temperature Coefficient: NP0; RoHS: Yes; ComponentLink1Description: Datasheet; ComponentLink1URL: https://wmsc.lcsc.com/wmsc/upload/file/pdf/v2/lcsc/2008051835_YAGEO-CC0603GRNPO9BN111_C519475.pdf; ComponentLink2Description: JLCPCB Part URL; ComponentLink2URL: https://jlcpcb.com/partdetail/C519475; ComponentLink3Description: LCSC Part URL; ComponentLink3URL: https://lcsc.com/product-detail/Multilayer-Ceramic-Capacitors-MLCC---SMD-SMT_YAGEO-YAGEO-CC0603GRNPO9BN111_C519475.html
footprint CAP-0603 (0603 (1608M) Capacitor)
pins: 1, 2

## CC0603GRNPO9BN120
designator C?  Capacitance: 12pF  (hidden comment: *)
Capacitor, Ceramic (MLCC), 12pF, ±2%, 50V, NP0, ±2%, SMD 0603; Manufacturer: YAGEO; Manufacturer Part Number: CC0603GRNPO9BN120; Package Size: 0603; JLCPCB Basic Part: No; JLCPCB Part Number: C519450; Supplier 1: LCSC; Category: Capacitors - MLCC; Supplier Part Number 1: C519450; Tolerance: ±2%; Voltage Rating: 50V; Temperature Coefficient: NP0; RoHS: Yes; ComponentLink1Description: Datasheet; ComponentLink1URL: https://wmsc.lcsc.com/wmsc/upload/file/pdf/v2/lcsc/2007161233_YAGEO-CC0603GRNPO9BN120_C519450.pdf; ComponentLink2Description: JLCPCB Part URL; ComponentLink2URL: https://jlcpcb.com/partdetail/C519450; ComponentLink3Description: LCSC Part URL; ComponentLink3URL: https://lcsc.com/product-detail/Multilayer-Ceramic-Capacitors-MLCC---SMD-SMT_YAGEO-YAGEO-CC0603GRNPO9BN120_C519450.html
footprint CAP-0603 (0603 (1608M) Capacitor)
pins: 1, 2

## CC0603GRNPO9BN121
designator C?  Capacitance: 120pF  (hidden comment: *)
Capacitor, Ceramic (MLCC), 120pF, ±2%, 50V, NP0, ±2%, SMD 0603; Manufacturer: YAGEO; Manufacturer Part Number: CC0603GRNPO9BN121; Package Size: 0603; JLCPCB Basic Part: No; JLCPCB Part Number: C327168; Supplier 1: LCSC; Category: Capacitors - MLCC; Supplier Part Number 1: C327168; Tolerance: ±2%; Voltage Rating: 50V; Temperature Coefficient: NP0; RoHS: Yes; ComponentLink1Description: Datasheet; ComponentLink1URL: https://wmsc.lcsc.com/wmsc/upload/file/pdf/v2/lcsc/1811141243_YAGEO-CC0603GRNPO9BN121_C327168.pdf; ComponentLink2Description: JLCPCB Part URL; ComponentLink2URL: https://jlcpcb.com/partdetail/C327168; ComponentLink3Description: LCSC Part URL; ComponentLink3URL: https://lcsc.com/product-detail/Multilayer-Ceramic-Capacitors-MLCC---SMD-SMT_YAGEO-YAGEO-CC0603GRNPO9BN121_C327168.html
footprint CAP-0603 (0603 (1608M) Capacitor)
pins: 1, 2

## CC0603GRNPO9BN122
designator C?  Capacitance: 1.2nF  (hidden comment: *)
Capacitor, Ceramic (MLCC), 1.2nF, ±2%, 50V, NP0, ±2%, SMD 0603; Manufacturer: YAGEO; Manufacturer Part Number: CC0603GRNPO9BN122; Package Size: 0603; JLCPCB Basic Part: No; JLCPCB Part Number: C576796; Supplier 1: LCSC; Category: Capacitors - MLCC; Supplier Part Number 1: C576796; Tolerance: ±2%; Voltage Rating: 50V; Temperature Coefficient: NP0; RoHS: Yes; ComponentLink1Description: Datasheet; ComponentLink1URL: https://wmsc.lcsc.com/wmsc/upload/file/pdf/v2/lcsc/2207141800_YAGEO-CC0603GRNPO9BN122_C576796.pdf; ComponentLink2Description: JLCPCB Part URL; ComponentLink2URL: https://jlcpcb.com/partdetail/C576796; ComponentLink3Description: LCSC Part URL; ComponentLink3URL: https://lcsc.com/product-detail/Multilayer-Ceramic-Capacitors-MLCC---SMD-SMT_YAGEO-YAGEO-CC0603GRNPO9BN122_C576796.html
footprint CAP-0603 (0603 (1608M) Capacitor)
pins: 1, 2

## CC0603GRNPO9BN130
designator C?  Capacitance: 13pF  (hidden comment: *)
Capacitor, Ceramic (MLCC), 13pF, ±2%, 50V, NP0, ±2%, SMD 0603; Manufacturer: YAGEO; Manufacturer Part Number: CC0603GRNPO9BN130; Package Size: 0603; JLCPCB Basic Part: No; JLCPCB Part Number: C519459; Supplier 1: LCSC; Category: Capacitors - MLCC; Supplier Part Number 1: C519459; Tolerance: ±2%; Voltage Rating: 50V; Temperature Coefficient: NP0; RoHS: Yes; ComponentLink1Description: Datasheet; ComponentLink1URL: https://wmsc.lcsc.com/wmsc/upload/file/pdf/v2/lcsc/2007161234_YAGEO-CC0603GRNPO9BN130_C519459.pdf; ComponentLink2Description: JLCPCB Part URL; ComponentLink2URL: https://jlcpcb.com/partdetail/C519459; ComponentLink3Description: LCSC Part URL; ComponentLink3URL: https://lcsc.com/product-detail/Multilayer-Ceramic-Capacitors-MLCC---SMD-SMT_YAGEO-YAGEO-CC0603GRNPO9BN130_C519459.html
footprint CAP-0603 (0603 (1608M) Capacitor)
pins: 1, 2

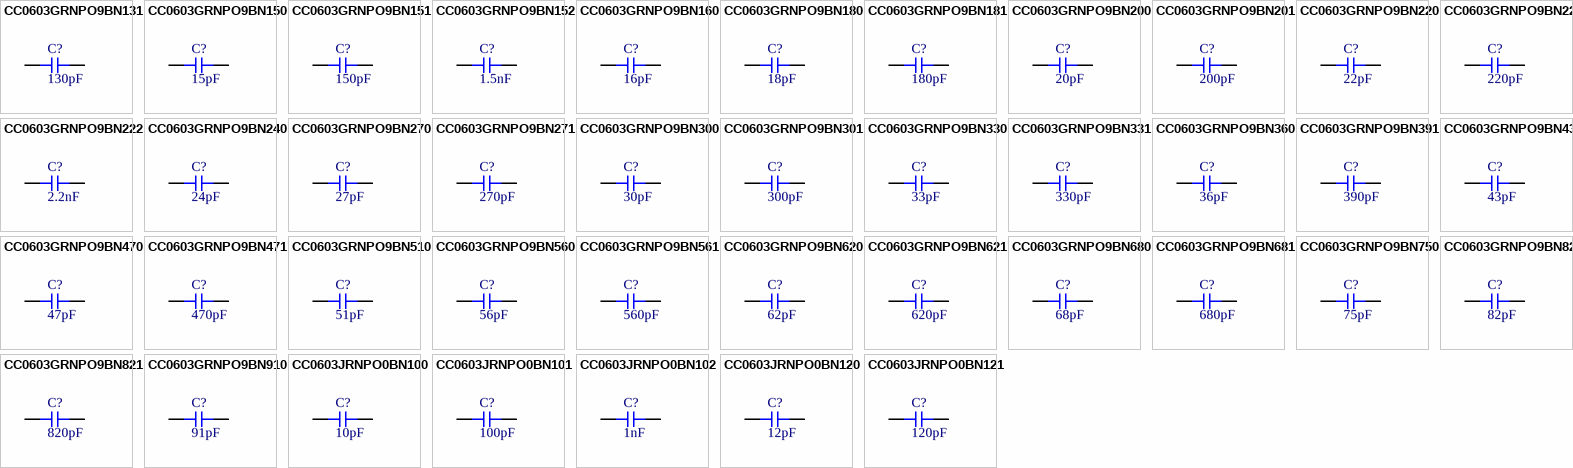
[diagram p38: symbols CC0603GRNPO9BN131 to CC0603JRNPO0BN121]

## CC0603GRNPO9BN131
designator C?  Capacitance: 130pF  (hidden comment: *)
Capacitor, Ceramic (MLCC), 130pF, ±2%, 50V, NP0, ±2%, SMD 0603; Manufacturer: YAGEO; Manufacturer Part Number: CC0603GRNPO9BN131; Package Size: 0603; JLCPCB Basic Part: No; JLCPCB Part Number: C519476; Supplier 1: LCSC; Category: Capacitors - MLCC; Supplier Part Number 1: C519476; Tolerance: ±2%; Voltage Rating: 50V; Temperature Coefficient: NP0; RoHS: Yes; ComponentLink1Description: Datasheet; ComponentLink1URL: https://wmsc.lcsc.com/wmsc/upload/file/pdf/v2/lcsc/2007161234_YAGEO-CC0603GRNPO9BN131_C519476.pdf; ComponentLink2Description: JLCPCB Part URL; ComponentLink2URL: https://jlcpcb.com/partdetail/C519476; ComponentLink3Description: LCSC Part URL; ComponentLink3URL: https://lcsc.com/product-detail/Multilayer-Ceramic-Capacitors-MLCC---SMD-SMT_YAGEO-YAGEO-CC0603GRNPO9BN131_C519476.html
footprint CAP-0603 (0603 (1608M) Capacitor)
pins: 1, 2

## CC0603GRNPO9BN150
designator C?  Capacitance: 15pF  (hidden comment: *)
Capacitor, Ceramic (MLCC), 15pF, ±2%, 50V, NP0, ±2%, SMD 0603; Manufacturer: YAGEO; Manufacturer Part Number: CC0603GRNPO9BN150; Package Size: 0603; JLCPCB Basic Part: No; JLCPCB Part Number: C519451; Supplier 1: LCSC; Category: Capacitors - MLCC; Supplier Part Number 1: C519451; Tolerance: ±2%; Voltage Rating: 50V; Temperature Coefficient: NP0; RoHS: Yes; ComponentLink1Description: Datasheet; ComponentLink1URL: https://wmsc.lcsc.com/wmsc/upload/file/pdf/v2/lcsc/2005181835_YAGEO-CC0603GRNPO9BN150_C519451.pdf; ComponentLink2Description: JLCPCB Part URL; ComponentLink2URL: https://jlcpcb.com/partdetail/C519451; ComponentLink3Description: LCSC Part URL; ComponentLink3URL: https://lcsc.com/product-detail/Multilayer-Ceramic-Capacitors-MLCC---SMD-SMT_YAGEO-YAGEO-CC0603GRNPO9BN150_C519451.html
footprint CAP-0603 (0603 (1608M) Capacitor)
pins: 1, 2

## CC0603GRNPO9BN151
designator C?  Capacitance: 150pF  (hidden comment: *)
Capacitor, Ceramic (MLCC), 150pF, ±2%, 50V, NP0, ±2%, SMD 0603; Manufacturer: YAGEO; Manufacturer Part Number: CC0603GRNPO9BN151; Package Size: 0603; JLCPCB Basic Part: No; JLCPCB Part Number: C519468; Supplier 1: LCSC; Category: Capacitors - MLCC; Supplier Part Number 1: C519468; Tolerance: ±2%; Voltage Rating: 50V; Temperature Coefficient: NP0; RoHS: Yes; ComponentLink1Description: Datasheet; ComponentLink1URL: https://wmsc.lcsc.com/wmsc/upload/file/pdf/v2/lcsc/2005181835_YAGEO-CC0603GRNPO9BN151_C519468.pdf; ComponentLink2Description: JLCPCB Part URL; ComponentLink2URL: https://jlcpcb.com/partdetail/C519468; ComponentLink3Description: LCSC Part URL; ComponentLink3URL: https://lcsc.com/product-detail/Multilayer-Ceramic-Capacitors-MLCC---SMD-SMT_YAGEO-YAGEO-CC0603GRNPO9BN151_C519468.html
footprint CAP-0603 (0603 (1608M) Capacitor)
pins: 1, 2

## CC0603GRNPO9BN152
designator C?  Capacitance: 1.5nF  (hidden comment: *)
Capacitor, Ceramic (MLCC), 1.5nF, ±2%, 50V, NP0, ±2%, SMD 0603; Manufacturer: YAGEO; Manufacturer Part Number: CC0603GRNPO9BN152; Package Size: 0603; JLCPCB Basic Part: No; JLCPCB Part Number: C576797; Supplier 1: LCSC; Category: Capacitors - MLCC; Supplier Part Number 1: C576797; Tolerance: ±2%; Voltage Rating: 50V; Temperature Coefficient: NP0; RoHS: Yes; ComponentLink1Description: Datasheet; ComponentLink1URL: https://wmsc.lcsc.com/wmsc/upload/file/pdf/v2/lcsc/2211030130_YAGEO-CC0603GRNPO9BN152_C576797.pdf; ComponentLink2Description: JLCPCB Part URL; ComponentLink2URL: https://jlcpcb.com/partdetail/C576797; ComponentLink3Description: LCSC Part URL; ComponentLink3URL: https://lcsc.com/product-detail/Multilayer-Ceramic-Capacitors-MLCC---SMD-SMT_YAGEO-YAGEO-CC0603GRNPO9BN152_C576797.html
footprint CAP-0603 (0603 (1608M) Capacitor)
pins: 1, 2

## CC0603GRNPO9BN160
designator C?  Capacitance: 16pF  (hidden comment: *)
Capacitor, Ceramic (MLCC), 16pF, ±2%, 50V, NP0, ±2%, SMD 0603; Manufacturer: YAGEO; Manufacturer Part Number: CC0603GRNPO9BN160; Package Size: 0603; JLCPCB Basic Part: No; JLCPCB Part Number: C519460; Supplier 1: LCSC; Category: Capacitors - MLCC; Supplier Part Number 1: C519460; Tolerance: ±2%; Voltage Rating: 50V; Temperature Coefficient: NP0; RoHS: Yes; ComponentLink1Description: Datasheet; ComponentLink1URL: https://wmsc.lcsc.com/wmsc/upload/file/pdf/v2/lcsc/2008122133_YAGEO-CC0603GRNPO9BN160_C519460.pdf; ComponentLink2Description: JLCPCB Part URL; ComponentLink2URL: https://jlcpcb.com/partdetail/C519460; ComponentLink3Description: LCSC Part URL; ComponentLink3URL: https://lcsc.com/product-detail/Multilayer-Ceramic-Capacitors-MLCC---SMD-SMT_YAGEO-YAGEO-CC0603GRNPO9BN160_C519460.html
footprint CAP-0603 (0603 (1608M) Capacitor)
pins: 1, 2

## CC0603GRNPO9BN180
designator C?  Capacitance: 18pF  (hidden comment: *)
Capacitor, Ceramic (MLCC), 18pF, ±2%, 50V, NP0, ±2%, SMD 0603; Manufacturer: YAGEO; Manufacturer Part Number: CC0603GRNPO9BN180; Package Size: 0603; JLCPCB Basic Part: No; JLCPCB Part Number: C519452; Supplier 1: LCSC; Category: Capacitors - MLCC; Supplier Part Number 1: C519452; Tolerance: ±2%; Voltage Rating: 50V; Temperature Coefficient: NP0; RoHS: Yes; ComponentLink1Description: Datasheet; ComponentLink1URL: https://wmsc.lcsc.com/wmsc/upload/file/pdf/v2/lcsc/2007161234_YAGEO-CC0603GRNPO9BN180_C519452.pdf; ComponentLink2Description: JLCPCB Part URL; ComponentLink2URL: https://jlcpcb.com/partdetail/C519452; ComponentLink3Description: LCSC Part URL; ComponentLink3URL: https://lcsc.com/product-detail/Multilayer-Ceramic-Capacitors-MLCC---SMD-SMT_YAGEO-YAGEO-CC0603GRNPO9BN180_C519452.html
footprint CAP-0603 (0603 (1608M) Capacitor)
pins: 1, 2

## CC0603GRNPO9BN181
designator C?  Capacitance: 180pF  (hidden comment: *)
Capacitor, Ceramic (MLCC), 180pF, ±2%, 50V, NP0, ±2%, SMD 0603; Manufacturer: YAGEO; Manufacturer Part Number: CC0603GRNPO9BN181; Package Size: 0603; JLCPCB Basic Part: No; JLCPCB Part Number: C519469; Supplier 1: LCSC; Category: Capacitors - MLCC; Supplier Part Number 1: C519469; Tolerance: ±2%; Voltage Rating: 50V; Temperature Coefficient: NP0; RoHS: Yes; ComponentLink1Description: Datasheet; ComponentLink1URL: https://wmsc.lcsc.com/wmsc/upload/file/pdf/v2/lcsc/2007101233_YAGEO-CC0603GRNPO9BN181_C519469.pdf; ComponentLink2Description: JLCPCB Part URL; ComponentLink2URL: https://jlcpcb.com/partdetail/C519469; ComponentLink3Description: LCSC Part URL; ComponentLink3URL: https://lcsc.com/product-detail/Multilayer-Ceramic-Capacitors-MLCC---SMD-SMT_YAGEO-YAGEO-CC0603GRNPO9BN181_C519469.html
footprint CAP-0603 (0603 (1608M) Capacitor)
pins: 1, 2

## CC0603GRNPO9BN200
designator C?  Capacitance: 20pF  (hidden comment: *)
Capacitor, Ceramic (MLCC), 20pF, ±2%, 50V, NP0, ±2%, SMD 0603; Manufacturer: YAGEO; Manufacturer Part Number: CC0603GRNPO9BN200; Package Size: 0603; JLCPCB Basic Part: No; JLCPCB Part Number: C325469; Supplier 1: LCSC; Category: Capacitors - MLCC; Supplier Part Number 1: C325469; Tolerance: ±2%; Voltage Rating: 50V; Temperature Coefficient: NP0; RoHS: Yes; ComponentLink1Description: Datasheet; ComponentLink1URL: https://wmsc.lcsc.com/wmsc/upload/file/pdf/v2/lcsc/1811031143_YAGEO-CC0603GRNPO9BN200_C325469.pdf; ComponentLink2Description: JLCPCB Part URL; ComponentLink2URL: https://jlcpcb.com/partdetail/C325469; ComponentLink3Description: LCSC Part URL; ComponentLink3URL: https://lcsc.com/product-detail/Multilayer-Ceramic-Capacitors-MLCC---SMD-SMT_YAGEO-YAGEO-CC0603GRNPO9BN200_C325469.html
footprint CAP-0603 (0603 (1608M) Capacitor)
pins: 1, 2
